# Altium footprint library heromap.PcbLib: 593 footprints (part 36 of 38)
Each footprint in its own frame and in the unit in brackets; x right, y up, seen from the top. Pads: shape width x height; smd on the part's side, far side on the other; paste and mask are expansions set on the pad; w line width, h text height; cw(c..) or ccw(c..) is an arc to the next point about the centre after c.
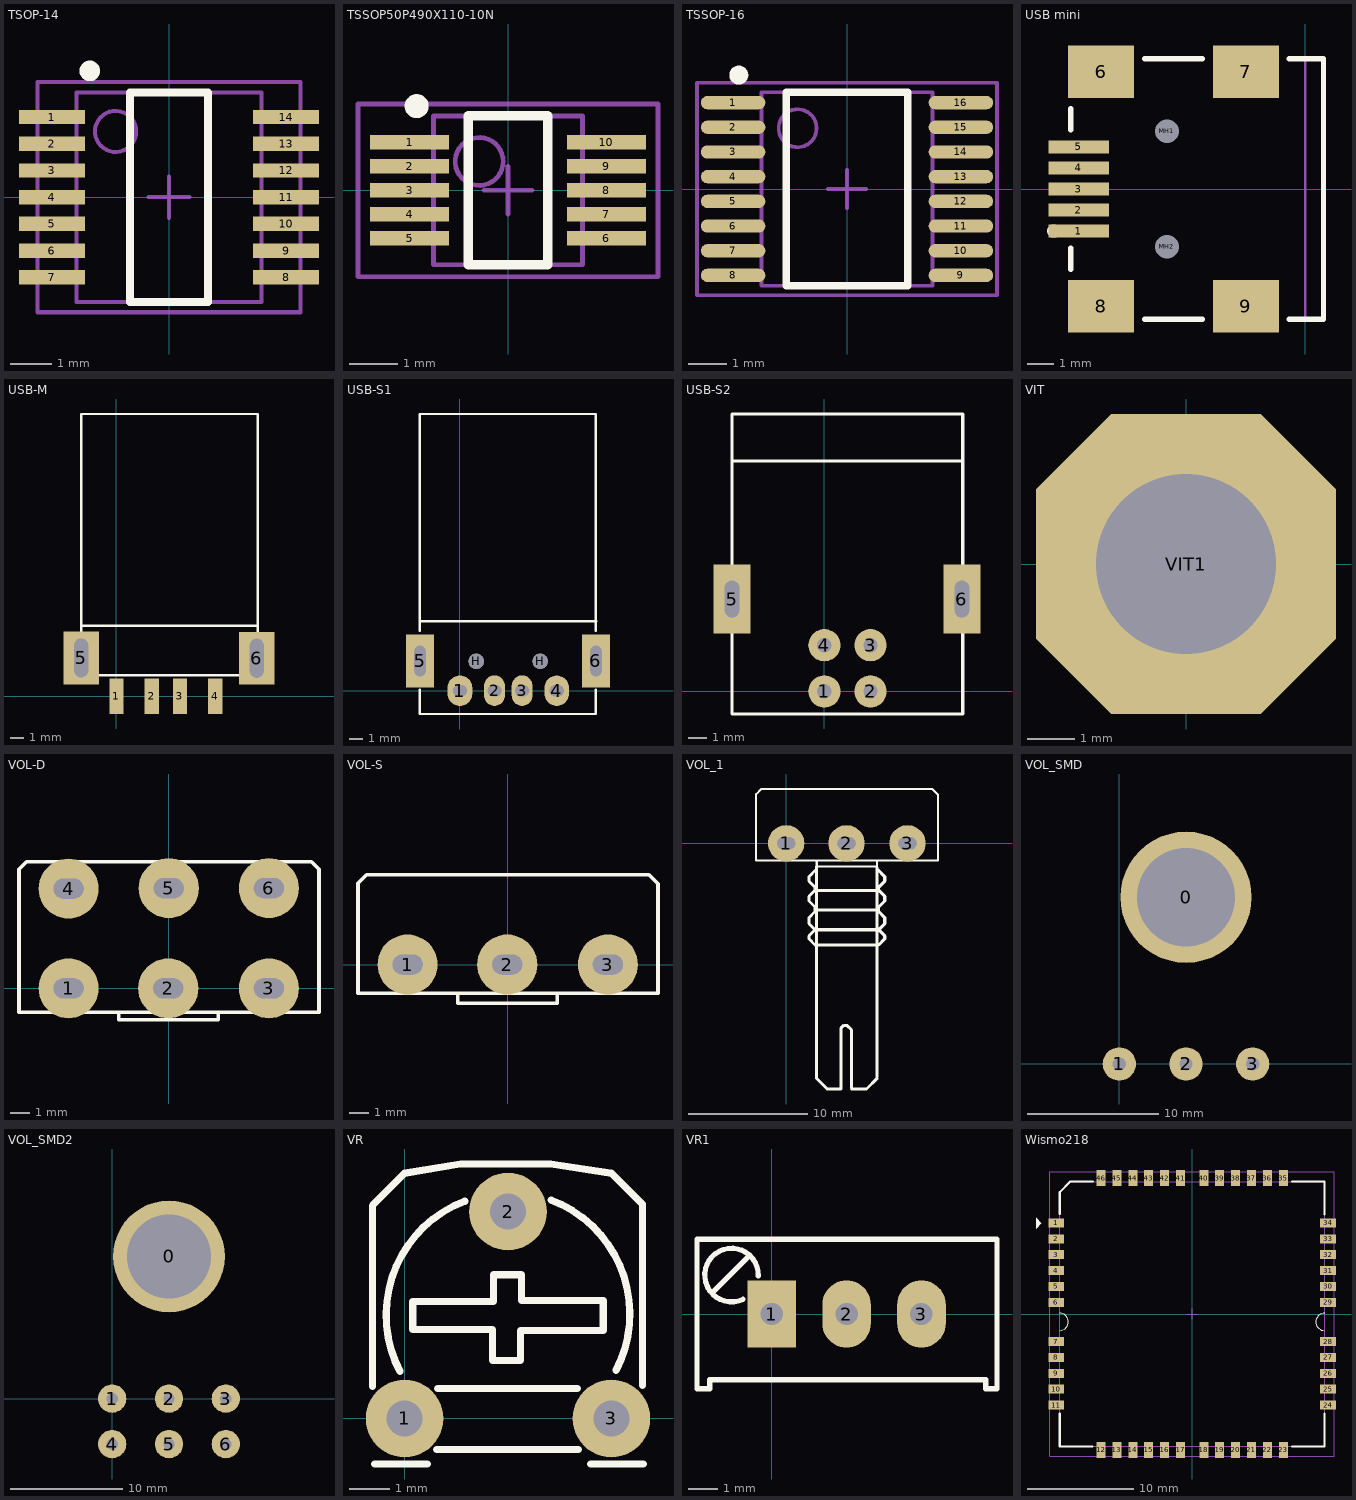
[diagram p35: the footprints below, top view; thin cyan lines are the x and y axes]

## TSOP-14 [mm] "TSOP, 14-Leads, Body 5,1x4,5mm (max), Pitch 0,65mm, IPC Medium Density"
height 1.2
pads (14):
  rect 1.6x0.35 smd: 1(-2.85,1.95) 2(-2.85,1.3) 3(-2.85,0.65) 4(-2.85,0) 5(-2.85,-0.65) 6(-2.85,-1.3) 7(-2.85,-1.95) 8(2.85,-1.95) 9(2.85,-1.3) 10(2.85,-0.65) 11(2.85,0) 12(2.85,0.65) 13(2.85,1.3) 14(2.85,1.95)
Top Overlay:
  circle w0.25: c-1.928,3.073 r0.125
  lines w0.2: -0.95,-2.55 0.95,-2.55 0.95,2.55 -0.95,2.55 -0.95,-2.55
Mechanical 13:
  circle w0.1: c-1.3,1.6 r0.5
  lines w0.1: -2.25,-2.55 2.25,-2.55 2.25,2.55 -2.25,2.55 -2.25,-2.55
Mechanical 15:
  lines w0.1: -0.5,0 0.5,0 ; 0,-0.5 0,0.5 ; -3.2,-2.8 3.2,-2.8 3.2,2.8 -3.2,2.8 -3.2,-2.8
3D body: height 1.2, standoff 0.1, extent -2.25,-2.55 2.25,2.55

## TSSOP50P490X110-10N [mm] "TSSOP, 10-Leads, Body 3,1x3,1mm (max), Pitch 0,50mm, IPC Medium Density"
height 1.1
pads (10):
  rect 1.65x0.3 smd: 1(-2.05,1) 2(-2.05,0.5) 3(-2.05,0) 4(-2.05,-0.5) 5(-2.05,-1) 6(2.05,-1) 7(2.05,-0.5) 8(2.05,0) 9(2.05,0.5) 10(2.05,1)
Top Overlay:
  circle w0.25: c-1.903,1.753 r0.125
  lines w0.2: -0.825,-1.55 0.825,-1.55 0.825,1.55 -0.825,1.55 -0.825,-1.55
Mechanical 13:
  circle w0.1: c-0.6,0.6 r0.5
  lines w0.1: -1.55,-1.55 1.55,-1.55 1.55,1.55 -1.55,1.55 -1.55,-1.55
Mechanical 15:
  lines w0.1: -0.5,0 0.5,0 ; 0,-0.5 0,0.5 ; -3.125,-1.8 3.125,-1.8 3.125,1.8 -3.125,1.8 -3.125,-1.8
3D body: height 1.1, standoff 0.1, extent -1.55,-1.55 1.55,1.55

## TSSOP-16 [mm]
height 1.2
pads (16):
  oval 1.7x0.35 smd: 1(-3,2.275) 2(-3,1.625) 3(-3,0.975) 4(-3,0.325) 5(-3,-0.325) 6(-3,-0.975) 7(-3,-1.625) 8(-3,-2.275) 9(3,-2.275) 10(3,-1.625) 11(3,-0.975) 12(3,-0.325) 13(3,0.325) 14(3,0.975) 15(3,1.625) 16(3,2.275)
Top Overlay:
  circle w0.25: c-2.85,3 r0.125
  lines w0.2: -1.6,-2.55 1.6,-2.55 1.6,2.55 -1.6,2.55 -1.6,-2.55
Mechanical 13:
  circle w0.1: c-1.3,1.6 r0.5
  lines w0.1: -2.25,-2.55 2.25,-2.55 2.25,2.55 -2.25,2.55 -2.25,-2.55
Mechanical 15:
  lines w0.1: -0.5,0 0.5,0 ; 0,-0.5 0,0.5 ; -3.95,-2.8 3.95,-2.8 3.95,2.8 -3.95,2.8 -3.95,-2.8
3D body: height 1.21, standoff 0, extent -1.88,1.756 -1.481,2.155
3D body: height 0.6, standoff 0.45, extent 2.25,-1.791 2.936,-1.46
3D body: height 0.6, standoff 0, extent 2.783,-1.791 2.936,-1.46
3D body: height 0.15, standoff 0, extent 2.783,-1.791 3.469,-1.46
3D body: height 0.6, standoff 0.45, extent 2.25,-2.451 2.936,-2.121
3D body: height 0.6, standoff 0, extent 2.783,-2.451 2.936,-2.121
3D body: height 0.15, standoff 0, extent 2.783,-2.451 3.469,-2.121
3D body: height 0.15, standoff 0, extent 2.783,-1.13 3.469,-0.8
3D body: height 0.6, standoff 0, extent 2.783,-1.13 2.936,-0.8
3D body: height 0.6, standoff 0.45, extent 2.25,-1.13 2.936,-0.8
3D body: height 0.15, standoff 0, extent 2.783,-0.47 3.469,-0.14
3D body: height 0.6, standoff 0, extent 2.783,-0.47 2.936,-0.14
3D body: height 0.6, standoff 0.45, extent 2.25,-0.47 2.936,-0.14
3D body: height 0.15, standoff 0, extent 2.783,0.165 3.469,0.495
3D body: height 0.6, standoff 0, extent 2.783,0.165 2.936,0.495
3D body: height 0.6, standoff 0.45, extent 2.25,0.165 2.936,0.495
3D body: height 0.15, standoff 0, extent 2.783,0.826 3.469,1.156
3D body: height 0.6, standoff 0, extent 2.783,0.826 2.936,1.156
3D body: height 0.6, standoff 0.45, extent 2.25,0.826 2.936,1.156
3D body: height 0.15, standoff 0, extent 2.783,1.46 3.469,1.791
3D body: height 0.6, standoff 0, extent 2.783,1.46 2.936,1.791
3D body: height 0.6, standoff 0.45, extent 2.25,1.46 2.936,1.791
3D body: height 0.15, standoff 0, extent 2.783,2.121 3.469,2.451
3D body: height 0.6, standoff 0, extent 2.783,2.121 2.936,2.451
3D body: height 0.6, standoff 0.45, extent 2.25,2.121 2.936,2.451
3D body: height 0.6, standoff 0.45, extent -2.936,-2.451 -2.25,-2.121
3D body: height 0.6, standoff 0, extent -2.936,-2.451 -2.783,-2.121
3D body: height 0.15, standoff 0, extent -3.469,-2.451 -2.783,-2.121
3D body: height 0.6, standoff 0.45, extent -2.936,-1.791 -2.25,-1.46
3D body: height 0.6, standoff 0, extent -2.936,-1.791 -2.783,-1.46
3D body: height 0.15, standoff 0, extent -3.469,-1.791 -2.783,-1.46
3D body: height 0.6, standoff 0.45, extent -2.936,-1.156 -2.25,-0.826
3D body: height 0.6, standoff 0, extent -2.936,-1.156 -2.783,-0.826
3D body: height 0.15, standoff 0, extent -3.469,-1.156 -2.783,-0.826
3D body: height 0.6, standoff 0.45, extent -2.936,-0.495 -2.25,-0.165
3D body: height 0.6, standoff 0, extent -2.936,-0.495 -2.783,-0.165
3D body: height 0.15, standoff 0, extent -3.469,-0.495 -2.783,-0.165
3D body: height 0.6, standoff 0.45, extent -2.936,0.14 -2.25,0.47
3D body: height 0.6, standoff 0, extent -2.936,0.14 -2.783,0.47
3D body: height 0.15, standoff 0, extent -3.469,0.14 -2.783,0.47
3D body: height 0.6, standoff 0.45, extent -2.936,0.8 -2.25,1.13
3D body: height 0.6, standoff 0, extent -2.936,0.8 -2.783,1.13
3D body: height 0.15, standoff 0, extent -3.469,0.8 -2.783,1.13
3D body: height 0.15, standoff 0, extent -3.469,2.121 -2.783,2.451
3D body: height 0.6, standoff 0, extent -2.936,2.121 -2.783,2.451
3D body: height 0.6, standoff 0.45, extent -2.936,2.121 -2.25,2.451
3D body: height 0.15, standoff 0, extent -3.469,1.46 -2.783,1.791
3D body: height 0.6, standoff 0, extent -2.936,1.46 -2.783,1.791
3D body: height 0.6, standoff 0.45, extent -2.936,1.46 -2.25,1.791
3D body: height 1.2, standoff 0, extent -2.25,-2.55 2.25,2.55

## USB mini [mm] "Connector; USB2.0, Type B, SM; 5 Position; Right Angle"
height 3.9
pads (11):
  rect 2.3x0.5 smd: 1(-8.6,-1.6) 2(-8.6,-0.8) 3(-8.6,0) 4(-8.6,0.8) 5(-8.6,1.6)
  rect 2.5x2 smd: 6(-7.75,4.45) 7(-2.25,4.45) 8(-7.75,-4.45) 9(-2.25,-4.45)
  round 0.6 hole 0.9 unplated: MH1(-5.25,2.2) MH2(-5.25,-2.2)
Top Overlay:
  circle w0.25: c-9.55,-1.6 r0.125
  lines w0.2: -8.9,-3.05 -8.9,-2.25 ; -8.9,2.25 -8.9,3.05 ; -6.1,-4.95 -3.9,-4.95 ; -6.1,4.95 -3.9,4.95 ; -0.6,-4.95 0.7,-4.95 0.7,4.95 -0.6,4.95
Mechanical 1:
  lines w0.1: 0,-4.95 0,4.95
  text "PCB Edge" at 0.432,-4.036 h0.25
3D body "SW3dPS-USB_mini_B.STEP": height 3.97, standoff -0.98, extent -8.558,-5.35 0.642,5.35

## USB-M [mil] "For USB SMD"
height 150
pads (6):
  rect 40x100 smd: 1(0,0) 2(100,0) 3(180,0) 4(280,0)
  rect 100x150 hole 40 slot 110 at 90 deg: 5(-100,109) 6(398,108)
Top Overlay:
  lines w7: -100,200 400,200 ; -100,60 400,60 400,800 -100,800 -100,60
3D body "User Library-USB Series A Plug.step": height 177.77, standoff 0.6, extent -88.44,27.17 384,748.83

## USB-S1 [mm] "USB A connector, 4pin, For USB sing"
height 2.54
pads (8):
  oval 1.778x2.2 hole 0.8 slot 1 at 0 deg: 1(0,0) 4(6.96,0)
  oval 1.5x2.2 hole 0.8 slot 1 at 0 deg: 2(2.489,0) 3(4.47,0)
  rect 2.032x3.81 hole 0.8 slot 2.2 at 90 deg: 5(-2.87,2.134) 6(9.779,2.134)
  round 1.1 hole 1.1: H(1.168,2.108) H(5.766,2.108)
Top Overlay:
  lines w0.178: -2.896,0.051 -2.896,-1.676 9.779,-1.676 9.779,0.051 ; -2.896,4.293 -2.896,19.888 9.779,19.888 9.779,4.293 ; -2.87,5.004 9.804,5.004
3D body "usb_a-usb_a-lp-c.stp": height 3.3, standoff -2.5, extent -2.827,-0.133 9.779,19.792

## USB-S2 [mil] "USB B connector, 4pin, For Print"
height 100
pads (6):
  round 70 hole 31: 1(0,0) 2(100,0) 3(100,100) 4(0,100)
  rect 80x150 hole 31 slot 80 at 90 deg: 5(-200,200) 6(298,200)
Top Overlay:
  lines w7: -200,499 300,499 ; -200,-49 300,-49 300,601 -200,601 -200,-49
3D body "Samtec3dPS-USBR-B.STEP": height 446.54, standoff -132.99, extent -247.29,-42 339.29,599.73

## VIT [mm] "VIT"
height 0.005
pads (1):
  oct 6.35x6.35 hole 3.81: VIT1(0,0)

## VOL-D [mil] "Volume control Dual"
height 400
pads (6):
  round 120 hole 40 slot 60 at 0 deg: 1(-200,0) 2(-1,0) 3(200,0) 4(-200,199) 5(0,200) 6(200,200)
Top Overlay:
  lines w7: -100,-48 -100,-63 99,-63 99,-48 ; -299,-48 300,-48 300,238 285,253 -284,253 -299,238 -299,-48

## VOL-S [mil] "Volume control single"
height 400
pads (3):
  round 120 hole 40 slot 60 at 0 deg: 1(-200,0) 2(-1,0) 3(200,0)
Top Overlay:
  lines w7: -100,-57 -100,-77 99,-77 99,-57 ; -299,-57 300,-57 300,161 282,179 -282,179 -299,162 -299,-57

## VOL_1 [mil]
pads (3):
  round 120 hole 40 slot 60 at 0 deg: 1(0,0) 2(199,0) 3(400,0)
Top Overlay:
  lines w7: 100,-57 100,-77 299,-77 299,-57 ; 101,-77 101,-57 ; -99,-57 500,-57 500,161 482,179 -82,179 -99,162 -99,-57
  lines w10: 95,-335 75,-315 75,-305 95,-285 75,-265 75,-245 95,-225 95,-210 75,-190 75,-175 95,-155 95,-145 75,-125 75,-110 100,-85 ; 95,-220 300,-220 ; 100,-770 100,-77 ; 100,-760 100,-775 135,-810 180,-810 180,-610 190,-600 200,-600 215,-615 215,-805 ; 100,-335 305,-335 325,-315 325,-305 305,-285 ; 100,-285 305,-285 ; 105,-155 300,-155 ; 215,-810 265,-810 300,-775 ; 300,-770 300,-80 ; 300,-85 325,-110 325,-125 305,-145 305,-155 325,-175 325,-190 305,-210 305,-225 325,-245 325,-265 305,-285
3D body "SW3dPS-Pot.STEP": height 839.35, standoff -130, extent -110,-818.11 510,188.11

## VOL_SMD [mm]
pads (4):
  round 10 hole 7.5: 0(5.08,12.7)
  round 2.54 hole 1.016: 1(0,0) 2(5.08,0) 3(10.16,0)
Bottom Overlay:
  circle w0.305: c10.16,3.81 r1.27
  circle w0.305: c5.08,3.81 r1.27
  circle w0.305: c0,3.81 r1.27
  circle w0.305: c5.08,12.7 r5.461
  lines w0.305: -1.454,7.663 cw(c5.08,12.7) 11.572,7.609 ; -1.397,7.595 3.226,7.595 ; -1.245,17.78 3.023,17.78 ; 7.137,7.569 11.557,7.569 ; 7.264,17.729 11.532,17.729 ; 11.557,7.493 12.7,6.35 12.7,-1.905 -2.54,-1.905 -2.54,6.477 ; -2.54,6.477 -1.397,7.62 -2.54,6.477
3D body "SW3dPS-omeg pot.STEP": height 22, standoff -10.35, extent -5.16,-6.276 15.24,24.056

## VOL_SMD2 [mil]
pads (7):
  round 393.7 hole 295.28: 0(200,500)
  round 100 hole 40: 1(0,0) 2(200,0) 3(400,0) 4(0,-160) 5(200,-160) 6(400,-160)
Bottom Overlay:
  circle w12: c400,150 r50
  circle w12: c200,150 r50
  circle w12: c0,150 r50
  circle w12: c200,500 r215.01
  lines w12: -100,-70 -100,-230 500,-230 500,-70 ; -57.25,301.71 cw(c200,500) 455.57,299.55 ; -55,299 127,299 ; -49,700 119,700 ; 281,298 455,298 ; 286,698 454,698 ; 455,295 500,250 500,-75 -100,-75 -100,255 ; -100,255 -55,300 -100,255

## VR [mil] "Resistor Variable"
height 200
pads (3):
  round 75 hole 35: 1(0,0) 2(100,200) 3(200,0)
Top Overlay:
  lines w7: -31,31 -31,206 0,237 54,246 141.5,246 200,237 230,207 230,32 ; -29,-44 22,-44 ; -4.35,45.34 cw(c100,100) 58.1,210.1 ; 8,113 8,86 85,86 85,56 112,56 112,85 192,85 192,114 113,114 113,139 86,139 86,113 9,113 ; 31,-30 168,-30 ; 32,29 167,29 ; 141.9,211.1 cw(c100,101) 204.35,46.34 ; 180,-44 231,-44
3D body "SW3dPS-Trimpot Horizontal.STEP": height 165.35, standoff -220.47, extent -86.85,-30 306.85,371.57

## VR1 [mil] "Variable Resistor"
height 400
pads (3):
  rect 65x90 hole 30: 1(0,0)
  oval 65x90 hole 30: 2(100,0) 3(200,0)
Top Overlay:
  lines w7: -80,28 -30,78 ; -38.6,19.63 cw(c-53.79,52.05) -18.01,50.77 ; -100,-100 -100,100 301,100 301,-100 286,-100 286,-88 -83,-88 -83,-100 -100,-100
3D body "SW3dPS-Bourns_3299W.STEP": height 455, standoff -45, extent -87.5,-130 287.5,110

## Wismo218 [mm] "LCC, 46-Pins, Body 25,0x25,0mm (max), Wismo218"
height 2.8
pads (46):
  rect 1.5x0.85 smd: 1(-12.825,8.6) 2(-12.825,7.1) 3(-12.825,5.6) 4(-12.825,4.1) 5(-12.825,2.6) 6(-12.825,1.1) 7(-12.825,-2.6) 8(-12.825,-4.1) 9(-12.825,-5.6) 10(-12.825,-7.1) 11(-12.825,-8.6) 24(12.825,-8.6) 25(12.825,-7.1) 26(12.825,-5.6) 27(12.825,-4.1) 28(12.825,-2.6) 29(12.825,1.1) 30(12.825,2.6) 31(12.825,4.1) 32(12.825,5.6) 33(12.825,7.1) 34(12.825,8.6)
  rect 0.85x1.5 smd: 12(-8.6,-12.825) 13(-7.1,-12.825) 14(-5.6,-12.825) 15(-4.1,-12.825) 16(-2.6,-12.825) 17(-1.1,-12.825) 18(1.1,-12.825) 19(2.6,-12.825) 20(4.1,-12.825) 21(5.6,-12.825) 22(7.1,-12.825) 23(8.6,-12.825) 35(8.6,12.825) 36(7.1,12.825) 37(5.6,12.825) 38(4.1,12.825) 39(2.6,12.825) 40(1.1,12.825) 41(-1.1,12.825) 42(-2.6,12.825) 43(-4.1,12.825) 44(-5.6,12.825) 45(-7.1,12.825) 46(-8.6,12.825)
Top Overlay:
  region: -14.737,8.047 -14.229,8.555 -14.737,9.063
  lines w0.1: -12.498,-1.559 ccw(c-12.498,-0.739) -12.482,0.081 ; 12.474,-1.567 cw(c12.49,-0.747) 12.49,0.073
  lines w0.2: -12.5,-12.5 -12.5,-9.407 ; -12.5,9.463 -12.5,11.5 -11.5,12.5 -9.371,12.5 ; -12.498,-12.505 -9.405,-12.505 ; 9.407,-12.5 12.5,-12.5 ; 9.407,12.5 12.5,12.5 ; 12.502,9.402 12.502,12.495 ; 12.505,-12.498 12.505,-9.405
Mechanical 13:
  lines w0.1: -12.5,-12.5 12.5,-12.5 12.5,12.5 -11.5,12.5 -12.5,11.5 -12.5,-12.5
Mechanical 15:
  lines w0.1: -0.5,0 0.5,0 ; 0,-0.5 0,0.5 ; -13.425,-13.425 -13.425,13.425 13.425,13.425 13.425,-13.425 -13.425,-13.425
3D body: height 0.9, standoff 0, extent -12.5,-12.5 12.5,12.5
3D body: height 2.8, standoff 0.8, extent -11.44,-11.428 11.438,11.394